# Altium footprint library cool_library.PcbLib: 1182 footprints (part 62 of 75)
Each footprint in its own frame and in the unit in brackets; x right, y up, seen from the top. Pads: shape width x height; smd on the part's side, far side on the other; paste and mask are expansions set on the pad; w line width, h text height; cw(c..) or ccw(c..) is an arc to the next point about the centre after c.
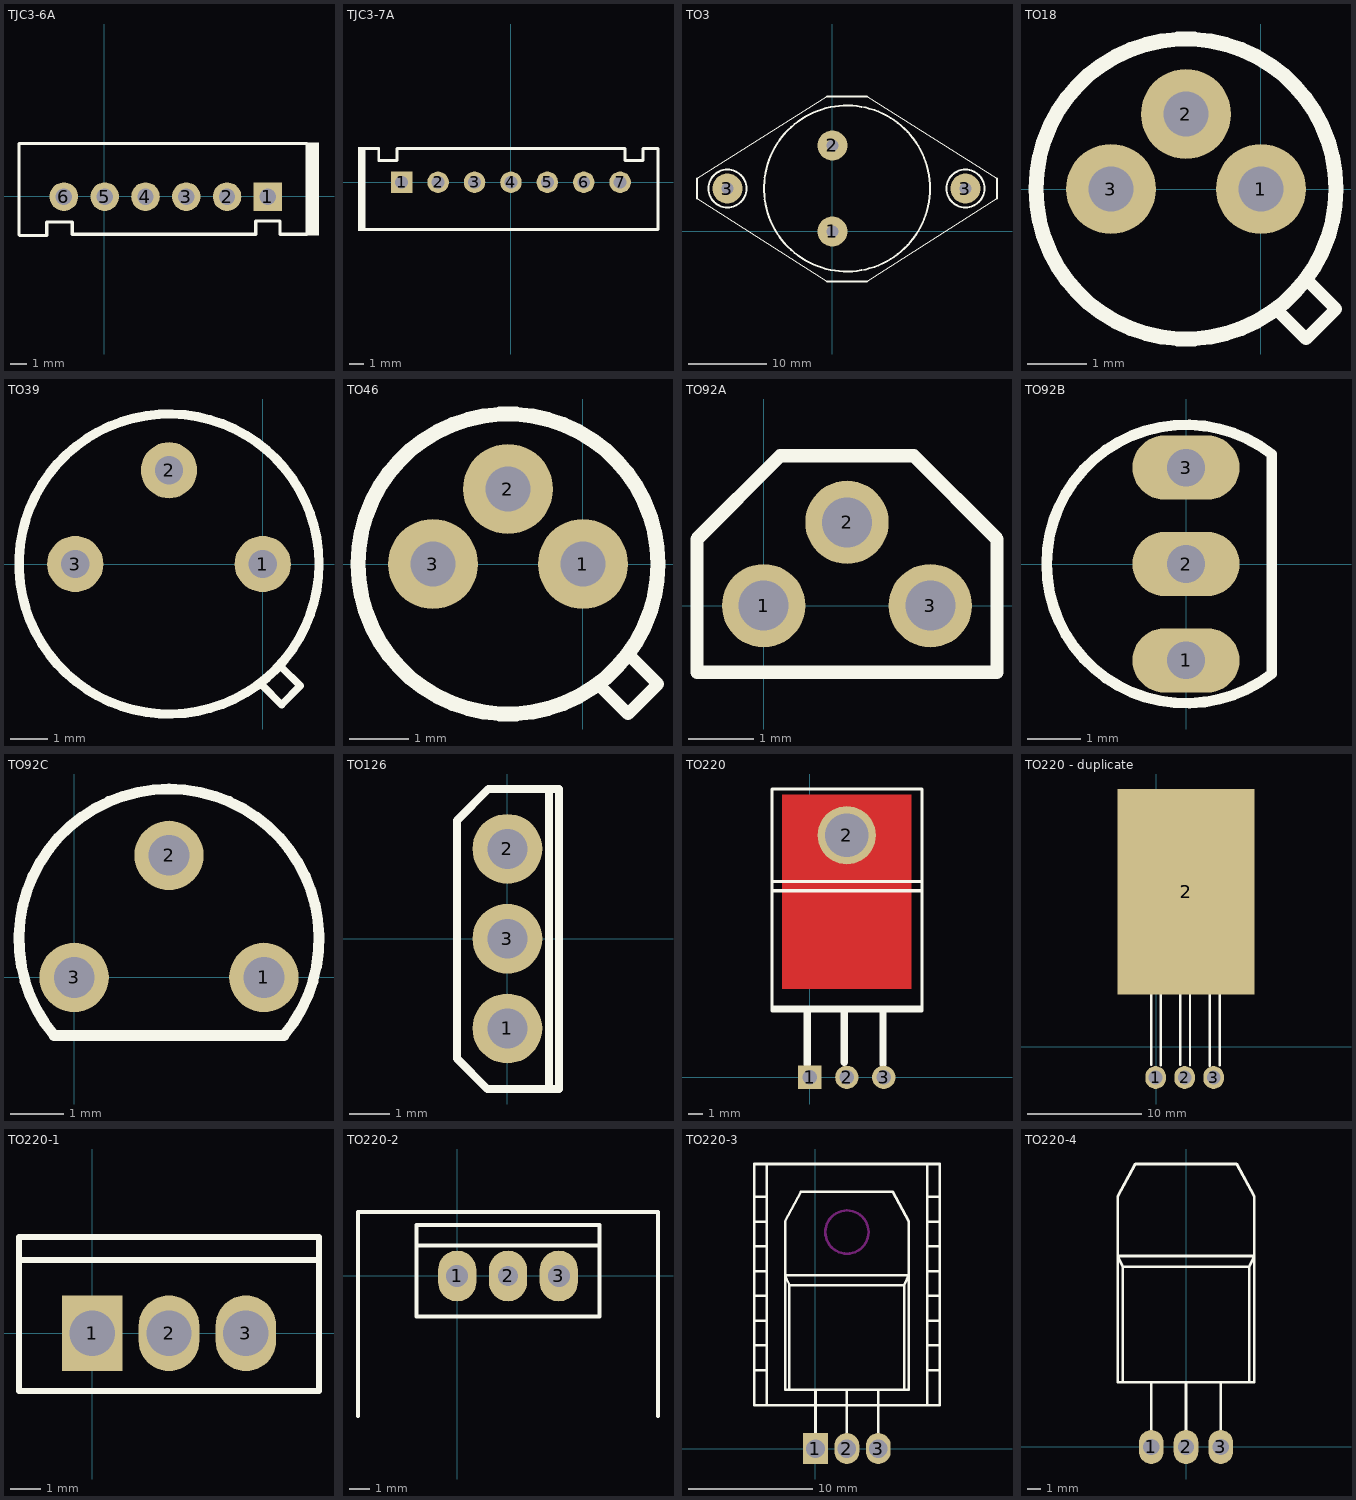
[diagram p61: the footprints below, top view; thin cyan lines are the x and y axes]

## TJC3-6A [mil]
pads (6):
  rect 70x70 hole 40: 1(400.67,-0.92)
  round 70 hole 40: 2(300.67,-0.92) 3(200.67,-0.92) 4(100.67,-0.92) 5(0.67,-0.92) 6(-99.33,-0.92)
Top Overlay:
  rectangle: 496.34,-96 526,131.5
  lines w8: -209.33,-94.92 -209.33,128.67 ; -209.33,129 5,129 496.34,129 496.34,-93.44 430.67,-93.44 430.67,-60.92 370.67,-60.92 370.67,-93.44 ; -208,-96 -141,-96 -141,-63.48 ; -140,-63 -80,-63 ; -79,-64 -79,-93 367.59,-93

## TJC3-7A [mm]
pads (7):
  rect 1.5x1.5 hole 0.9: 1(-7.62,0)
  round 1.5 hole 0.9: 2(-5.08,0) 3(-2.54,0) 4(0,0) 5(2.54,0) 6(5.08,0) 7(7.62,0)
Top Overlay:
  rectangle: -10.668,-3.404 -10.262,2.464
  lines w0.203: -10.262,-3.302 10.262,-3.302 10.262,2.362 9.22,2.362 9.22,1.524 7.95,1.524 7.95,2.362 -7.95,2.362 -7.95,1.524 -9.22,1.524 -9.22,2.362 -10.262,2.362 -10.262,-3.302

## TO3 [mm]
pads (4):
  round 3.81 hole 1.5: 1(0,0) 2(0,10.922) 3(-13.335,5.461) 3(16.891,5.461)
Top Overlay:
  circle w0.254: c-13.335,5.461 r2.413
  circle w0.254: c16.891,5.461 r2.413
  circle w0.254: c1.854,5.461 r10.541
  lines w0.203: -17.196,4.191 -17.196,6.731 -0.686,17.145 4.394,17.145 20.904,6.731 20.904,4.191 4.394,-6.35 -0.686,-6.35 -17.196,4.191

## TO18 [mil]
pads (3):
  round 60 hole 30: 1(0,0) 2(-50,50) 3(-100,0)
Top Overlay:
  circle w10: c-50,0 r100
  lines w8: 10,-80 30,-100 50,-80 30,-60

## TO39 [mil]
pads (3):
  round 60 hole 30: 1(0,0) 2(-100,100) 3(-200,0)
Top Overlay:
  circle w10: c-100,0 r160
  lines w8: 0,-130 20,-150 40,-130 20,-110

## TO46 [mil]
pads (3):
  round 60 hole 30: 1(0,0) 2(-50,50) 3(-100,0)
Top Overlay:
  circle w10: c-50,0 r100
  lines w8: 10,-80 30,-100 50,-80 30,-60

## TO92A [mil] "7805/7809/LP2950电源芯片（未加焊）"
pads (3):
  round 50 hole 30: 1(0,0) 2(50,50) 3(100,0)
Top Overlay:
  lines w8: -40,-40 -40,40 10,90 90,90 140,40 140,-40 -40,-40
3D body: height 269.29, standoff -118.11, extent -39.17,-37.8 138.78,96.06

## TO92B [mm] "TO, Flat Index; 3 In-Line, Axial Leads; Body Dia. 4.8mm; Leads 0.48 x 0.5 mm (max)"
height 5.33
pads (3):
  oval 2x1.2 hole 0.7: 1(0,-1.8) 2(0,0) 3(0,1.8)
Top Overlay:
  lines w0.2: 1.601,-2.049 cw(c0,0) 1.601,2.049 ; 1.6,-1.99 1.6,1.99
3D body: height 3, standoff 0, extent -0.25,-2.04 0.25,-1.6
3D body: height 3, standoff 0, extent -0.25,-0.22 0.25,0.22
3D body: height 3, standoff 0, extent -0.246,1.583 0.254,2.023
3D body: height 8, standoff 3, extent -2.612,-2.6 1.657,2.602

## TO92C [mm]
pads (3):
  round 1.3 hole 0.762: 1(3.556,0) 2(1.778,2.286) 3(0,0)
Top Overlay:
  lines w0.2: -0.375,-1.087 cw(c1.778,0.72) 3.931,-1.087
  lines w0.203: -0.379,-1.09 3.935,-1.09

## TO126 [mm] "BD135"
pads (3):
  round 1.75 hole 1: 1(0,-2.25) 2(0,2.25) 3(0,0)
Top Overlay:
  lines w0.2: 1.041,-3.734 1.041,3.734 ; -1.268,-3.005 -0.506,-3.767 1.295,-3.767 1.295,3.752 -0.48,3.752 -1.268,2.964 -1.268,-3.005
3D body: height 14.6, standoff -3.35, extent -1.797,-3.934 0.903,3.866

## TO220 [mm]
pads (4):
  rect 1.6x1.6 hole 1: 1(0,0)
  round 1.6 hole 1: 2(2.54,0) 3(5.08,0)
  round 4 hole 3: 2(2.54,16.637)
Top Layer:
  rectangle: -1.905,6.071 6.985,19.431
Top Overlay:
  lines w0.22: -2.591,4.699 7.696,4.699 ; -2.591,4.826 7.696,4.826 ; -2.591,12.827 7.696,12.827 ; -2.591,13.462 7.696,13.462 ; -2.591,19.05 -2.591,19.812 7.696,19.812 7.696,4.572 -2.591,4.572 -2.591,19.558
  lines w0.5: -0.178,0.889 -0.178,4.572 ; 2.362,1.016 2.362,4.699 ; 5.029,0.889 5.029,4.572
3D body: height 4.5, standoff -3, extent -2.638,-0.127 7.362,19.577
3D body: height 4.5, standoff -3, extent -2.46,-0.254 7.54,19.45

## TO220 - duplicate [mm]
pads (4):
  oval 1.8x2 hole 1.2: 1(-0.06,-2.69) 2(2.48,-2.69) 3(5.02,-2.69)
  rect 12x18 smd: 2(2.6,13.56)
Top Overlay:
  lines w0.2: -2.54,16.51 -2.54,5.08 7.62,5.08 7.62,16.51 ; -2.54,19.05 -2.54,20.32 7.62,20.32 7.62,19.05 ; -0.45,-1.58 -0.45,5.08 ; 0.38,-1.64 0.38,5.02 ; 2.1,-1.56 2.1,5.06 ; 2.95,-1.6 2.95,5.06 ; 4.67,-1.66 4.67,5.02 ; 5.56,-1.63 5.56,5.03

## TO220-1 [mm]
pads (3):
  rect 2x2.5 hole 1.5: 1(0,0)
  oval 2x2.5 hole 1.5: 2(2.54,0) 3(5.08,0)
Top Overlay:
  lines w0.203: 7.493,2.921 7.493,3.175 ; -2.413,2.413 -2.413,3.175 7.493,3.175 ; -2.413,2.413 -2.413,-1.905 7.493,-1.905 7.493,2.413 ; -2.413,2.413 7.493,2.413 ; 7.493,2.413 7.493,3.175

## TO220-2 [mm]
pads (3):
  oval 1.905x2.54 hole 1.1: 1(0,0) 3(5.08,0)
  oval 1.905x2.54 hole 1: 2(2.54,0)
Top Overlay:
  lines w0.203: -4.96,-7 -4.96,3.2 10.04,3.2 10.04,-7 ; -2.032,1.524 7.112,1.524 ; -2.032,-2.032 7.112,-2.032 7.112,2.54 -2.032,2.54 -2.032,-2.032

## TO220-3 [mm]
pads (3):
  rect 2x2.5 hole 1.5: 1(0,0)
  oval 2x2.5 hole 1.5: 2(2.54,0) 3(5.08,0)
Top Overlay:
  lines w0.203: -4.953,6.343 -3.953,6.343 ; -4.953,8.343 -3.953,8.343 ; -4.953,10.343 -3.953,10.343 ; -4.953,12.343 -3.953,12.343 ; -4.953,14.343 -3.953,14.343 ; -4.953,16.343 -3.953,16.343 ; -4.953,18.343 -3.953,18.343 ; -4.953,20.343 -3.953,20.343 ; -3.953,3.505 -3.953,23.005 ; -2.46,14 7.54,14 ; -2.46,14.005 -2.104,13.217 ; -2.46,18.377 -2.46,4.75 7.54,4.75 7.54,18.377 ; -2.46,18.388 -1.172,20.75 6.252,20.75 7.54,18.388 ; -2.104,4.75 -2.104,13.217 ; 0,0 0,4.75 ; 2.54,0 2.54,4.75 ; 5.08,0 5.08,4.75 ; 7.184,4.75 7.184,13.217 ; 7.54,14.005 7.184,13.217 ; 9.047,3.505 9.047,23.005 ; 9.047,6.343 10.047,6.343 ; 9.047,8.343 10.047,8.343 ; 9.047,10.343 10.047,10.343 ; 9.047,12.343 10.047,12.343 ; 9.047,14.343 10.047,14.343 ; 9.047,16.343 10.047,16.343 ; 9.047,18.343 10.047,18.343 ; 9.047,20.343 10.047,20.343 ; -2.104,13.217 7.184,13.217 ; -4.953,3.505 10.047,3.505 10.047,23.005 -4.953,23.005 -4.953,3.505
Keep-Out Layer:
  circle w0.2: c2.547,17.505 r1.75
  circle w0.2: c2.54,17.5 r1.75

## TO220-4 [mm]
pads (3):
  oval 1.8x2.5 hole 1.2: 1(-2.54,0) 2(0,0) 3(2.54,0)
Top Overlay:
  lines w0.203: -5,14 5,14 ; -5,14.005 -4.644,13.217 ; -5,18.377 -5,4.75 5,4.75 5,18.377 ; -5,18.388 -3.712,20.75 3.712,20.75 5,18.388 ; -4.644,4.75 -4.644,13.217 ; -2.54,0 -2.54,4.75 ; 0,0 0,4.75 ; 2.54,0 2.54,4.75 ; 4.644,4.75 4.644,13.217 ; 5,14.005 4.644,13.217 ; -4.644,13.217 4.644,13.217